# Altium footprint library HeadersPin_1rows_M_180.PcbLib: 40 footprints (part 2 of 3)
Each footprint in its own frame and in the unit in brackets; x right, y up, seen from the top. Pads: shape width x height; smd on the part's side, far side on the other; paste and mask are expansions set on the pad; w line width, h text height; cw(c..) or ccw(c..) is an arc to the next point about the centre after c.
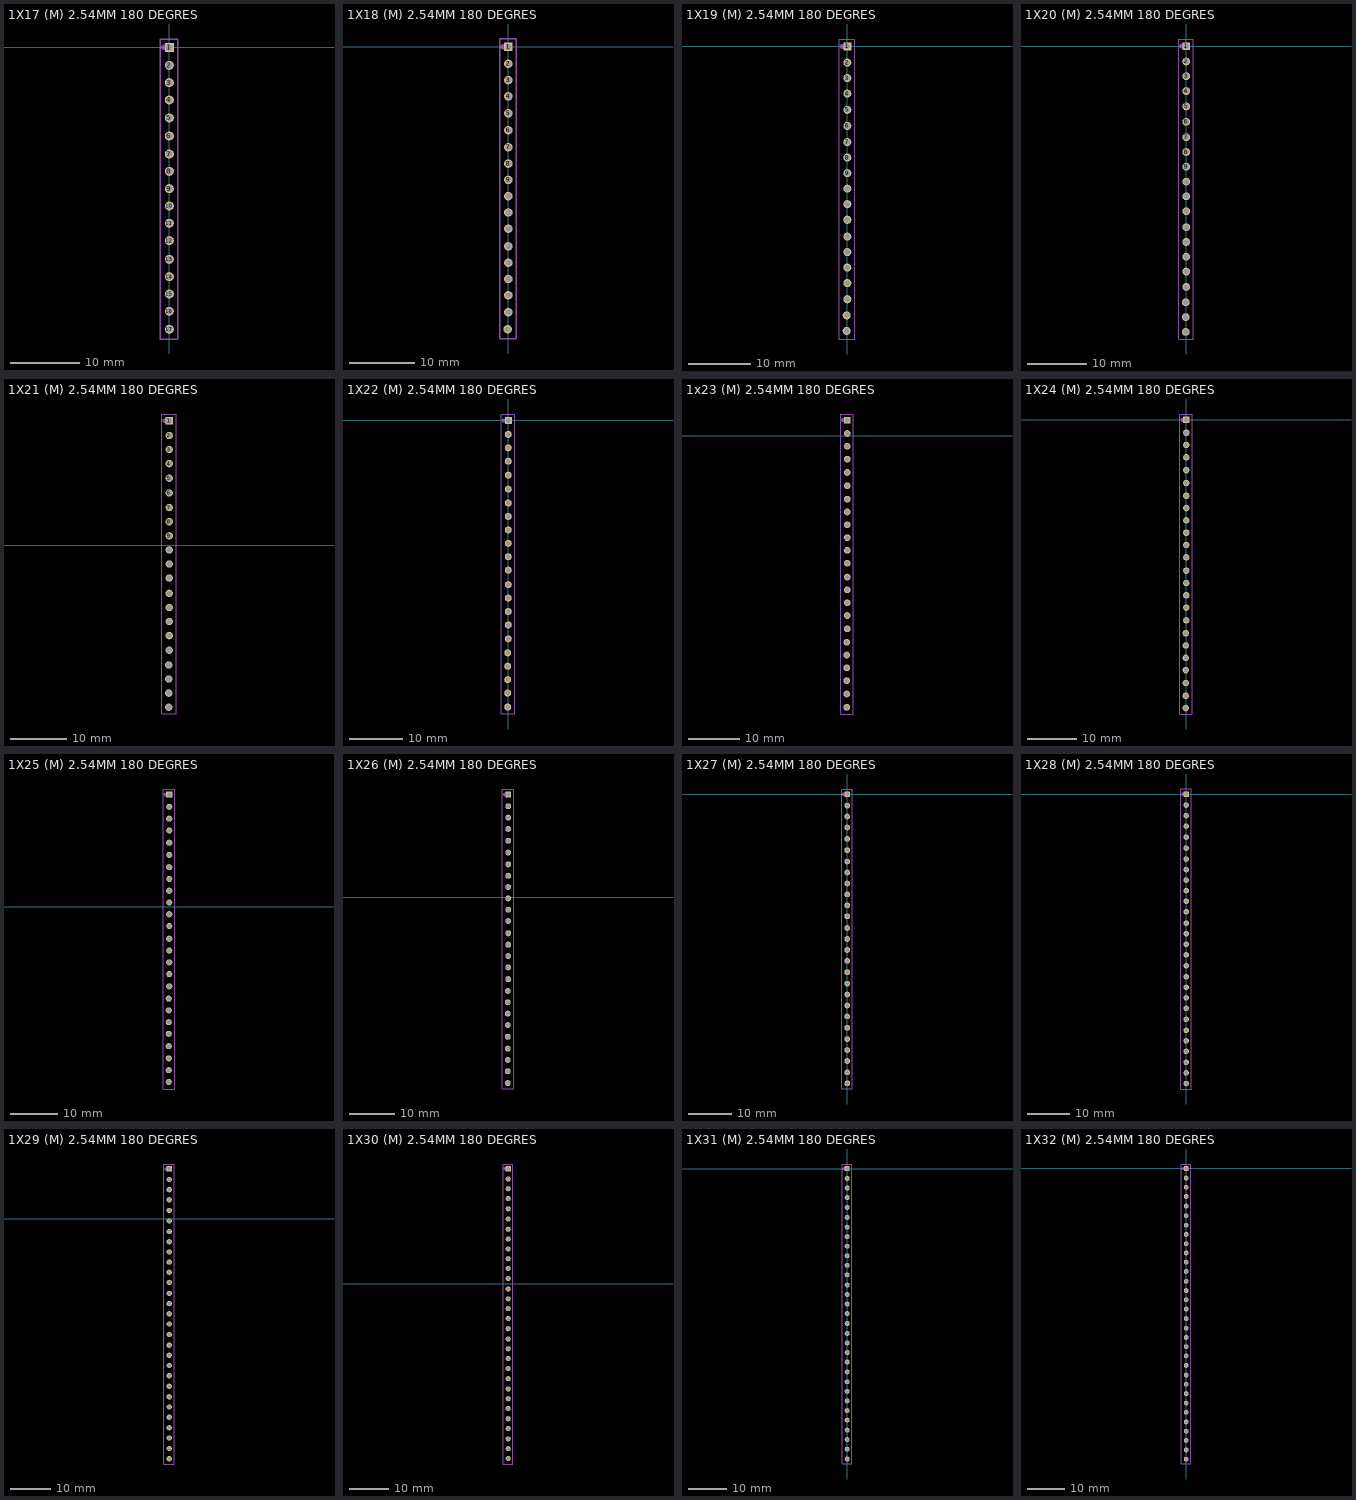
[diagram p1: the footprints below, top view; thin cyan lines are the x and y axes]

## 1X17 (M) 2.54MM 180 DEGRES [mm]
pads (17):
  rect 1.3x1.3 hole 0.9 mask+0.05: 1(0,0)
  round 1.3 hole 0.9 mask+0.05: 2(0,-2.6) 3(0,-5.1) 4(0,-7.6) 5(0,-10.2) 6(0,-12.8) 7(0,-15.4) 8(0,-17.9) 9(0,-20.4) 10(0,-22.9) 11(0,-25.4) 12(0,-27.9) 13(0,-30.6) 14(0,-33.1) 15(0,-35.6) 16(0,-38.1) 17(0,-40.7)
Mechanical 2:
  circle w0.4: c-0.8,0 r0.2
  lines w0.2: -1.3,-42.1 -1.3,1.2 1.2,1.2 1.2,-42.1 -1.3,-42.1
  text ".Designator" at 0.738,-12.446 h1.52
3D body "1x17 Male Pin Header.STEP": height 10.54, standoff -3, extent -1.3,-41.985 1.2,1.2

## 1X18 (M) 2.54MM 180 DEGRES [mm]
pads (18):
  rect 1.3x1.3 hole 0.9 mask+0.05: 1(0,0)
  round 1.3 hole 0.9 mask+0.05: 2(0,-2.6) 3(0,-5.1) 4(0,-7.6) 5(0,-10.2) 6(0,-12.8) 7(0,-15.4) 8(0,-17.9) 9(0,-20.4) 10(0,-22.9) 11(0,-25.4) 12(0,-27.9) 13(0,-30.6) 14(0,-33.1) 15(0,-35.6) 16(0,-38.1) 17(0,-40.7) 18(-0.1,-43.3)
Mechanical 2:
  circle w0.4: c-0.8,0 r0.2
  lines w0.2: -1.3,-44.8 1.2,-44.8 1.2,1.2 -1.3,1.2 -1.3,-44.8
  text ".Designator" at 0.638,-13.246 h1.52
3D body "1x18 Male Pin Header.STEP": height 10.54, standoff -3, extent -1.3,-44.525 1.2,1.2

## 1X19 (M) 2.54MM 180 DEGRES [mm]
pads (19):
  rect 1.3x1.3 hole 0.9 mask+0.05: 1(0,0)
  round 1.3 hole 0.9 mask+0.05: 2(0,-2.6) 3(0,-5.1) 4(0,-7.6) 5(0,-10.2) 6(0,-12.8) 7(0,-15.4) 8(0,-17.9) 9(0,-20.4) 10(0,-22.9) 11(0,-25.4) 12(0,-27.9) 13(0,-30.6) 14(0,-33.1) 15(0,-35.6) 16(0,-38.1) 17(0,-40.7) 18(-0.1,-43.3) 19(-0.1,-45.8)
Mechanical 2:
  circle w0.4: c-0.8,0 r0.2
  lines w0.2: -1.3,-47.1 -1.3,1.2 1.2,1.2 1.2,-47.1 -1.3,-47.1
  text ".Designator" at 0.638,-13.246 h1.52
3D body "1x19 Male Pin Header.STEP": height 10.54, standoff -3, extent -1.3,-47.065 1.2,1.2

## 1X20 (M) 2.54MM 180 DEGRES [mm]
pads (20):
  rect 1.3x1.3 hole 0.9 mask+0.05: 1(0,0)
  round 1.3 hole 0.9 mask+0.05: 2(0,-2.6) 3(0,-5.1) 4(0,-7.6) 5(0,-10.2) 6(0,-12.8) 7(0,-15.4) 8(0,-17.9) 9(0,-20.4) 10(0,-22.9) 11(0,-25.4) 12(0,-27.9) 13(0,-30.6) 14(0,-33.1) 15(0,-35.6) 16(0,-38.1) 17(0,-40.7) 18(-0.1,-43.3) 19(-0.1,-45.8) 20(-0.1,-48.3)
Mechanical 2:
  circle w0.4: c-0.8,0 r0.2
  lines w0.2: -1.3,-49.5 1.2,-49.5 1.2,1.2 -1.3,1.2 -1.3,-49.5
  text ".Designator" at 0.638,-13.246 h1.52
3D body "1x20 Male Pin Header.STEP": height 10.54, standoff -3, extent -1.3,-49.552 1.2,1.252

## 1X21 (M) 2.54MM 180 DEGRES [mm]
pads (21):
  rect 1.3x1.3 hole 0.9 mask+0.05: 1(92.8,22.1)
  round 1.3 hole 0.9 mask+0.05: 2(92.8,19.5) 3(92.8,17) 4(92.8,14.5) 5(92.8,11.9) 6(92.8,9.3) 7(92.8,6.7) 8(92.8,4.2) 9(92.8,1.7) 10(92.8,-0.8) 11(92.8,-3.3) 12(92.8,-5.8) 13(92.8,-8.5) 14(92.8,-11) 15(92.8,-13.5) 16(92.8,-16) 17(92.8,-18.6) 18(92.7,-21.2) 19(92.7,-23.7) 20(92.7,-26.2) 21(92.7,-28.7)
Mechanical 2:
  circle w0.4: c92,22.1 r0.2
  lines w0.2: 91.5,-29.9 91.5,23.3 94,23.3 94,-29.9 91.5,-29.9
  text ".Designator" at 93.438,8.854 h1.52
3D body "1x21 Male Pin Header.STEP": height 10.54, standoff -3, extent 91.5,-30.045 94,23.3

## 1X22 (M) 2.54MM 180 DEGRES [mm]
pads (22):
  rect 1.3x1.3 hole 0.9 mask+0.05: 1(0,0)
  round 1.3 hole 0.9 mask+0.05: 2(0,-2.6) 3(0,-5.1) 4(0,-7.6) 5(0,-10.2) 6(0,-12.8) 7(0,-15.4) 8(0,-17.9) 9(0,-20.4) 10(0,-22.9) 11(0,-25.4) 12(0,-27.9) 13(0,-30.6) 14(0,-33.1) 15(0,-35.6) 16(0,-38.1) 17(0,-40.7) 18(-0.1,-43.3) 19(-0.1,-45.8) 20(-0.1,-48.3) 21(-0.1,-50.8) 22(-0.1,-53.4)
Mechanical 2:
  circle w0.4: c-0.8,0 r0.2
  lines w0.2: -1.3,-54.7 -1.3,1.2 1.2,1.2 1.2,-54.7 -1.3,-54.7
  text ".Designator" at 0.638,-13.246 h1.52
3D body "1x22 Male Pin Header.STEP": height 10.54, standoff -3, extent -1.3,-54.685 1.2,1.2

## 1x23 (M) 2.54MM 180 DEGRES [mm]
pads (23):
  rect 1.3x1.3 hole 0.9 mask+0.05: 1(93.9,3)
  round 1.3 hole 0.9 mask+0.05: 2(93.9,0.4) 3(93.9,-2.1) 4(93.9,-4.6) 5(93.9,-7.2) 6(93.9,-9.8) 7(93.9,-12.4) 8(93.9,-14.9) 9(93.9,-17.4) 10(93.9,-19.9) 11(93.9,-22.4) 12(93.9,-24.9) 13(93.9,-27.6) 14(93.9,-30.1) 15(93.9,-32.6) 16(93.9,-35.1) 17(93.9,-37.7) 18(93.8,-40.3) 19(93.8,-42.8) 20(93.8,-45.3) 21(93.8,-47.8) 22(93.8,-50.4) 23(93.8,-53)
Mechanical 2:
  circle w0.4: c93.1,3 r0.2
  lines w0.2: 92.6,-54.3 92.6,4.2 95.1,4.2 95.1,-54.3 92.6,-54.3
  text ".Designator" at 94.538,-10.246 h1.52
3D body "1x23 Male Pin Header.STEP": height 10.54, standoff -3, extent 92.6,-54.225 95.1,4.2

## 1X24 (M) 2.54MM 180 DEGRES [mm]
pads (24):
  rect 1.3x1.3 hole 0.9 mask+0.05: 1(0,0)
  round 1.3 hole 0.9 mask+0.05: 2(0,-2.6) 3(0,-5.1) 4(0,-7.6) 5(0,-10.2) 6(0,-12.8) 7(0,-15.4) 8(0,-17.9) 9(0,-20.4) 10(0,-22.9) 11(0,-25.4) 12(0,-27.9) 13(0,-30.6) 14(0,-33.1) 15(0,-35.6) 16(0,-38.1) 17(0,-40.7) 18(-0.1,-43.3) 19(-0.1,-45.8) 20(-0.1,-48.3) 21(-0.1,-50.8) 22(-0.1,-53.4) 23(-0.1,-56) 24(-0.1,-58.5)
Mechanical 2:
  circle w0.4: c-0.8,0 r0.2
  lines w0.2: -1.3,-59.7 -1.3,1.2 1.2,1.2 1.2,-59.7 -1.3,-59.7
  text ".Designator" at 0.638,-13.246 h1.52
3D body "1x24 Male Pin Header.STEP": height 10.54, standoff -3, extent -1.3,-59.765 1.2,1.2

## 1X25 (M) 2.54MM 180 DEGRES [mm]
pads (25):
  rect 1.3x1.3 hole 0.9 mask+0.05: 1(151.4,23.8)
  round 1.3 hole 0.9 mask+0.05: 2(151.4,21.2) 3(151.4,18.7) 4(151.4,16.2) 5(151.4,13.6) 6(151.4,11) 7(151.4,8.4) 8(151.4,5.9) 9(151.4,3.4) 10(151.4,0.9) 11(151.4,-1.6) 12(151.4,-4.1) 13(151.4,-6.8) 14(151.4,-9.3) 15(151.4,-11.8) 16(151.4,-14.3) 17(151.4,-16.9) 18(151.3,-19.5) 19(151.3,-22) 20(151.3,-24.5) 21(151.3,-27) 22(151.3,-29.6) 23(151.3,-32.2) 24(151.3,-34.7) 25(151.3,-37.2)
Mechanical 2:
  circle w0.4: c150.6,23.8 r0.2
  lines w0.2: 150.1,-38.7 150.1,25 152.6,25 152.6,-38.7 150.1,-38.7
  text ".Designator" at 152.038,10.554 h1.52
3D body "1x25 Male Pin Header.STEP": height 10.54, standoff -3, extent 150.1,-38.505 152.6,25

## 1X26 (M) 2.54MM 180 DEGRES [mm]
pads (26):
  rect 1.3x1.3 hole 0.9 mask+0.05: 1(90.6,22.7)
  round 1.3 hole 0.9 mask+0.05: 2(90.6,20.1) 3(90.6,17.6) 4(90.6,15.1) 5(90.6,12.5) 6(90.6,9.9) 7(90.6,7.3) 8(90.6,4.8) 9(90.6,2.3) 10(90.6,-0.2) 11(90.6,-2.7) 12(90.6,-5.2) 13(90.6,-7.9) 14(90.6,-10.4) 15(90.6,-12.9) 16(90.6,-15.4) 17(90.6,-18) 18(90.5,-20.6) 19(90.5,-23.1) 20(90.5,-25.6) 21(90.5,-28.1) 22(90.5,-30.7) 23(90.5,-33.3) 24(90.5,-35.8) 25(90.5,-38.3) 26(90.5,-40.9)
Mechanical 2:
  circle w0.4: c89.8,22.7 r0.2
  lines w0.2: 89.3,-42.2 89.3,23.9 91.8,23.9 91.8,-42.2 89.3,-42.2
  text ".Designator" at 91.238,9.454 h1.52
3D body "1x26 Male Pin Header.STEP": height 10.54, standoff -3, extent 89.3,-42.145 91.8,23.9

## 1X27 (M) 2.54MM 180 DEGRES [mm]
pads (27):
  rect 1.3x1.3 hole 0.9 mask+0.05: 1(0,0)
  round 1.3 hole 0.9 mask+0.05: 2(0,-2.6) 3(0,-5.1) 4(0,-7.6) 5(0,-10.2) 6(0,-12.8) 7(0,-15.4) 8(0,-17.9) 9(0,-20.4) 10(0,-22.9) 11(0,-25.4) 12(0,-27.9) 13(0,-30.6) 14(0,-33.1) 15(0,-35.6) 16(0,-38.1) 17(0,-40.7) 18(0,-43.3) 19(0,-45.8) 20(0,-48.3) 21(0,-50.8) 22(0,-53.4) 23(0,-56) 24(0,-58.5) 25(0,-61) 26(0,-63.6) 27(0,-66.1)
Mechanical 2:
  circle w0.4: c-0.8,0 r0.2
  lines w0.2: -1.3,-67.4 1.2,-67.4 1.2,1.2 -1.3,1.2 -1.3,-67.4
  text ".Designator" at 0.638,-13.246 h1.52
3D body "1x27 Male Pin Header.STEP": height 10.54, standoff -3, extent -1.3,-67.385 1.2,1.2

## 1X28 (M) 2.54MM 180 DEGRES [mm]
pads (28):
  rect 1.3x1.3 hole 0.9 mask+0.05: 1(0,0)
  round 1.3 hole 0.9 mask+0.05: 2(0,-2.6) 3(0,-5.1) 4(0,-7.6) 5(0,-10.2) 6(0,-12.8) 7(0,-15.4) 8(0,-17.9) 9(0,-20.4) 10(0,-22.9) 11(0,-25.4) 12(0,-27.9) 13(0,-30.6) 14(0,-33.1) 15(0,-35.6) 16(0,-38.1) 17(0,-40.7) 18(0,-43.3) 19(0,-45.8) 20(0,-48.3) 21(0,-50.8) 22(0,-53.4) 23(0,-56) 24(0,-58.5) 25(0,-61) 26(0,-63.6) 27(0,-66.1) 28(0,-68.6)
Mechanical 2:
  circle w0.4: c-0.8,0 r0.2
  lines w0.2: -1.3,-69.9 1.2,-69.9 1.2,1.2 -1.3,1.2 -1.3,-69.9
  text ".Designator" at 0.638,-13.246 h1.52
3D body "1x28 Male Pin Header.STEP": height 10.54, standoff -3, extent -1.3,-69.925 1.2,1.2

## 1X29 (M) 2.54MM 180 DEGRES [mm]
pads (29):
  rect 1.3x1.3 hole 0.9 mask+0.05: 1(126.7,12.3)
  round 1.3 hole 0.9 mask+0.05: 2(126.7,9.7) 3(126.7,7.2) 4(126.7,4.7) 5(126.7,2.1) 6(126.7,-0.5) 7(126.7,-3.1) 8(126.7,-5.6) 9(126.7,-8.1) 10(126.7,-10.6) 11(126.7,-13.1) 12(126.7,-15.6) 13(126.7,-18.3) 14(126.7,-20.8) 15(126.7,-23.3) 16(126.7,-25.8) 17(126.7,-28.4) 18(126.7,-31) 19(126.7,-33.5) 20(126.7,-36) 21(126.7,-38.5) 22(126.7,-41.1) 23(126.7,-43.7) 24(126.7,-46.2) 25(126.7,-48.7) 26(126.7,-51.3) 27(126.7,-53.8) 28(126.7,-56.4) 29(126.7,-58.9)
Mechanical 2:
  circle w0.4: c125.9,12.3 r0.2
  lines w0.2: 125.4,-60.2 127.9,-60.2 127.9,13.5 125.4,13.5 125.4,-60.2
  text ".Designator" at 127.338,-0.946 h1.52
3D body "1x29 Male Pin Header.STEP": height 10.54, standoff -3, extent 125.4,-60.165 127.9,13.5

## 1X30 (M) 2.54MM 180 DEGRES [mm]
pads (30):
  rect 1.3x1.3 hole 0.9 mask+0.05: 1(116.6,29.3)
  round 1.3 hole 0.9 mask+0.05: 2(116.6,26.7) 3(116.6,24.2) 4(116.6,21.7) 5(116.6,19.1) 6(116.6,16.5) 7(116.6,13.9) 8(116.6,11.4) 9(116.6,8.9) 10(116.6,6.4) 11(116.6,3.9) 12(116.6,1.4) 13(116.6,-1.3) 14(116.6,-3.8) 15(116.6,-6.3) 16(116.6,-8.8) 17(116.6,-11.4) 18(116.6,-14) 19(116.6,-16.5) 20(116.6,-19) 21(116.6,-21.5) 22(116.6,-24.1) 23(116.6,-26.7) 24(116.6,-29.2) 25(116.6,-31.7) 26(116.6,-34.3) 27(116.6,-36.8) 28(116.6,-39.4) 29(116.6,-41.9) 30(116.6,-44.4)
Mechanical 2:
  circle w0.4: c115.8,29.3 r0.2
  lines w0.2: 115.3,-45.8 115.3,30.5 117.8,30.5 117.8,-45.8 115.3,-45.8
  text ".Designator" at 117.238,16.054 h1.52
3D body "1x30 Male Pin Header.STEP": height 10.54, standoff -3, extent 115.3,-45.705 117.8,30.5

## 1X31 (M) 2.54MM 180 DEGRES [mm]
pads (31):
  rect 1.3x1.3 hole 0.9 mask+0.05: 1(0,0)
  round 1.3 hole 0.9 mask+0.05: 2(0,-2.6) 3(0,-5.1) 4(0,-7.6) 5(0,-10.2) 6(0,-12.8) 7(0,-15.4) 8(0,-17.9) 9(0,-20.4) 10(0,-22.9) 11(0,-25.4) 12(0,-27.9) 13(0,-30.6) 14(0,-33.1) 15(0,-35.6) 16(0,-38.1) 17(0,-40.7) 18(0,-43.3) 19(0,-45.8) 20(0,-48.3) 21(0,-50.8) 22(0,-53.4) 23(0,-56) 24(0,-58.5) 25(0,-61) 26(0,-63.6) 27(0,-66.1) 28(0,-68.7) 29(0,-71.2) 30(0,-73.7) 31(0,-76.3)
Mechanical 2:
  circle w0.4: c-0.8,0 r0.2
  lines w0.2: -1.3,-77.6 -1.3,1.2 1.2,1.2 1.2,-77.6 -1.3,-77.6
  text ".Designator" at 0.638,-13.246 h1.52
3D body "1x31 Male Pin Header.STEP": height 10.54, standoff -3, extent -1.3,-77.545 1.2,1.2

## 1X32 (M) 2.54MM 180 DEGRES [mm]
pads (32):
  rect 1.3x1.3 hole 0.9 mask+0.05: 1(0,0)
  round 1.3 hole 0.9 mask+0.05: 2(0,-2.6) 3(0,-5.1) 4(0,-7.6) 5(0,-10.2) 6(0,-12.8) 7(0,-15.4) 8(0,-17.9) 9(0,-20.4) 10(0,-22.9) 11(0,-25.4) 12(0,-27.9) 13(0,-30.6) 14(0,-33.1) 15(0,-35.6) 16(0,-38.1) 17(0,-40.7) 18(0,-43.3) 19(0,-45.8) 20(0,-48.3) 21(0,-50.8) 22(0,-53.4) 23(0,-56) 24(0,-58.5) 25(0,-61) 26(0,-63.6) 27(0,-66.1) 28(0,-68.7) 29(0,-71.2) 30(0,-73.7) 31(0,-76.3) 32(0,-78.8)
Mechanical 2:
  circle w0.4: c-0.8,0 r0.2
  lines w0.2: -1.3,-80.1 1.2,-80.1 1.2,1.2 -1.3,1.2 -1.3,-80.1
  text ".Designator" at 0.638,-13.246 h1.52
3D body "1x32 Male Pin Header.STEP": height 10.54, standoff -3, extent -1.3,-80.085 1.2,1.2